# Altium footprint library PCB封装库.PcbLib: 109 footprints (part 4 of 7)
Each footprint in its own frame and in the unit in brackets; x right, y up, seen from the top. Pads: shape width x height; smd on the part's side, far side on the other; paste and mask are expansions set on the pad; w line width, h text height; cw(c..) or ccw(c..) is an arc to the next point about the centre after c.
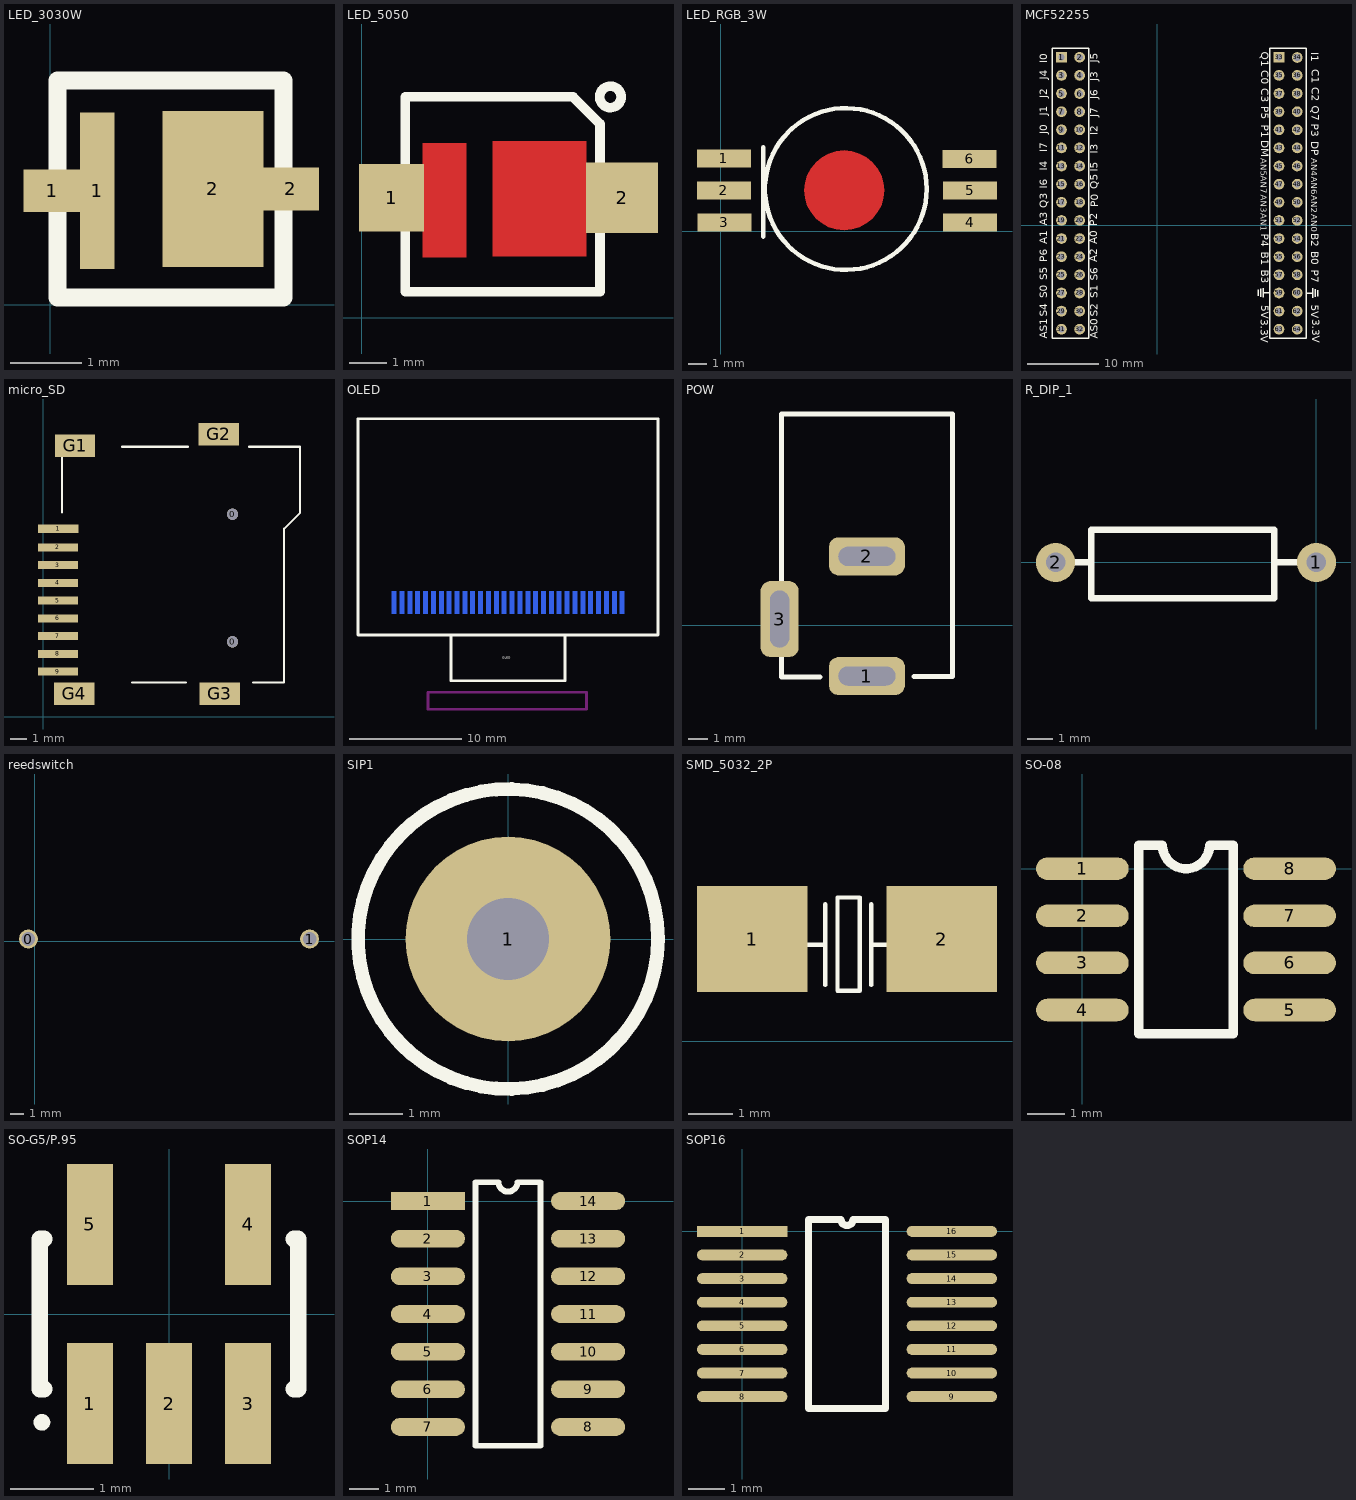
[diagram p3: the footprints below, top view; thin cyan lines are the x and y axes]

## LED_3030W [mm]
pads (4):
  rect 0.8x0.6 smd: 1(0.025,1.6) 2(3.378,1.626)
  rect 0.48x2.2 smd: 1(0.66,1.6)
  rect 1.42x2.2 smd: 2(2.286,1.626)
Top Overlay:
  lines w0.254: 0.102,0.102 3.277,0.102 3.277,3.15 0.102,3.15 0.102,0.102

## LED_5050 [mm]
pads (2):
  rect 1.72x1.78 smd: 1(0.787,3.175)
  rect 1.9x1.87 smd: 2(6.883,3.175)
Top Layer:
  rectangle: 3.454,1.626 5.944,4.674
  rectangle: 1.6,1.6 2.769,4.623
Top Overlay:
  circle w0.254: c6.574,5.842 r0.284
  lines w0.254: 1.143,0.686 1.143,5.842 5.588,5.842 6.299,5.131 6.299,0.686 1.143,0.686
Top Paste:
  rectangle: 1.6,1.6 2.769,4.623
  rectangle: 3.454,1.626 5.944,4.674
Top Solder:
  rectangle: 3.404,1.575 5.994,4.724
  rectangle: 1.549,1.549 2.819,4.674

## LED_RGB_3W [mm]
pads (6):
  rect 3x1 smd: 1(0.178,4.064) 2(0.178,2.286) 3(0.203,0.508) 4(13.868,0.508) 5(13.868,2.286) 6(13.843,4.039)
Top Layer:
  region: 7.301,4.462 7.716,4.336 8.1,4.131 8.436,3.855 8.711,3.519 8.916,3.136 9.042,2.72 9.085,2.287 9.042,1.855 8.916,1.439 8.711,1.056 8.436,0.72 8.1,0.444 7.716,0.239 7.301,0.113 6.868,0.07 6.436,0.113 6.02,0.239 5.636,0.444 5.3,0.72 5.025,1.056 4.82,1.439 4.694,1.855 4.651,2.287 4.694,2.72 4.82,3.136 5.025,3.519 5.3,3.855 5.636,4.131 6.02,4.336 6.436,4.462 6.868,4.504
Top Overlay:
  circle w0.254: c6.955,2.362 r4.5
  lines w0.254: 2.362,-0.279 2.362,4.674

## MCF52255 [mm]
pads (64):
  rect 1.5x1.5 hole 0.9: 1(-13.454,23.521) 33(17.026,23.521)
  round 1.5 hole 0.9: 2(-10.914,23.521) 3(-13.454,20.981) 4(-10.914,20.981) 5(-13.454,18.441) 6(-10.914,18.441) 7(-13.454,15.901) 8(-10.914,15.901) 9(-13.454,13.361) 10(-10.914,13.361) 11(-13.454,10.821) 12(-10.914,10.821) 13(-13.454,8.281) 14(-10.914,8.281) 15(-13.454,5.741) 16(-10.914,5.741) 17(-13.454,3.201) 18(-10.914,3.201) 19(-13.454,0.661) 20(-10.914,0.661) 21(-13.454,-1.879) 22(-10.914,-1.879) 23(-13.454,-4.419) 24(-10.914,-4.419) 25(-13.454,-6.959) 26(-10.914,-6.959) 27(-13.454,-9.499) 28(-10.914,-9.499) 29(-13.454,-12.039) 30(-10.914,-12.039) 31(-13.454,-14.579) 32(-10.914,-14.579) 35(17.026,20.981) 36(19.566,20.981) 37(17.026,18.441) 38(19.566,18.441) 39(17.026,15.901) 40(19.566,15.901) 41(17.026,13.361) 42(19.566,13.361) 43(17.026,10.821) 44(19.566,10.821) 45(17.026,8.281) 46(19.566,8.281) 47(17.026,5.741) 48(19.566,5.741) 49(17.026,3.201) 50(19.566,3.201) 51(17.026,0.661) 52(19.566,0.661) 53(17.026,-1.879) 54(19.566,-1.879) 55(17.026,-4.419) 56(19.566,-4.419) 57(17.026,-6.959) 58(19.566,-6.959) 59(17.026,-9.499) 60(19.566,-9.499) 61(17.026,-12.039) 62(19.566,-12.039) 63(17.026,-14.579) 64(19.566,-14.579)
  round 1.5 hole 1: 34(19.583,23.495)
Top Overlay:
  lines w0.2: 14.13,-9.88 14.13,-9.067 ; 14.486,-10.007 14.486,-8.94 ; 14.841,-10.134 14.841,-8.813 ; 14.841,-9.473 15.705,-9.473 ; 20.886,-9.524 21.75,-9.524 ; 21.75,-10.184 21.75,-8.864 ; 22.106,-10.057 22.106,-8.991 ; 22.461,-9.93 22.461,-9.118 ; -14.724,-15.849 -9.644,-15.849 -9.644,24.791 -14.724,24.791 -14.724,-15.849 ; 15.756,-15.849 20.836,-15.849 20.836,24.791 15.756,24.791 15.756,-15.849
  text "I2" at -8.019,12.574 h1.8
  text "J6" at -8.019,17.654 h1.8
  text "J7" at -8.019,15.114 h1.8
  text "DP" at 21.191,11.736 h1.8
  text "DM" at 14.181,11.863 h1.8
  text "P4" at 14.181,-1.193 h1.8
  text "B3" at 14.181,-6.273 h1.8
  text "B2" at 21.217,-1.142 h1.8
  text "B0" at 21.217,-3.682 h1.8
  text "B1" at 14.181,-3.733 h1.8
  text "C2" at 21.242,19.305 h1.8
  text "C3" at 14.155,19.153 h1.8
  text "C1" at 21.242,21.845 h1.8
  text "C0" at 14.155,21.693 h1.8
  text "J1" at -15.105,15.317 h1.8
  text "J0" at -15.105,12.726 h1.8
  text "I7" at -15.08,10.186 h1.8
  text "I1" at 21.166,24.207 h1.8
  text "I0" at -15.131,22.709 h1.8
  text "Q3" at -15.131,2.389 h1.8
  text "Q5" at -8.044,5.056 h1.8
  text "Q7" at 21.242,16.765 h1.8
  text "Q1" at 14.155,24.283 h1.8
  text "3.3V" at 14.13,-13.207 h1.8
  text "3.3V" at 21.318,-13.156 h1.8
  text "5V" at 14.155,-11.2 h1.8
  text "5V" at 21.217,-11.15 h1.8
  text "P0" at -7.976,2.54 h1.8
  text "P2" at -8.07,-0.151 h1.8
  text "P6" at -15.105,-5.181 h1.8
  text "P1" at 14.181,14.047 h1.8
  text "P3" at 21.217,14.2 h1.8
  text "P5" at 14.181,16.663 h1.8
  text "P7" at 21.191,-6.222 h1.8
  text "AN5" at 14.13,9.399 h1.5
  text "AN7" at 14.13,6.935 h1.5
  text "AN2" at 21.217,4.192 h1.5
  text "AN0" at 21.217,1.55 h1.5
  text "AN1" at 14.105,1.677 h1.5
  text "AN3" at 14.13,4.294 h1.5
  text "AN6" at 21.217,6.808 h1.5
  text "AN4" at 21.217,9.348 h1.5
  text "J2" at -15.131,17.806 h1.8
  text "J3" at -8.019,20.194 h1.8
  text "J4" at -15.131,20.346 h1.8
  text "J5" at -8.019,22.734 h1.8
  text "S0" at -15.105,-10.261 h1.8
  text "S1" at -8.044,-10.261 h1.8
  text "S2" at -8.044,-12.851 h1.8
  text "S4" at -15.105,-12.801 h1.8
  text "S5" at -15.105,-7.721 h1.8
  text "S6" at -8.044,-7.771 h1.8
  text "AS1" at -15.131,-15.95 h1.8
  text "AS0" at -8.019,-15.95 h1.8
  text "A0" at -8.07,-2.691 h1.8
  text "A2" at -8.07,-5.231 h1.8
  text "A1" at -15.105,-2.641 h1.8
  text "A3" at -15.105,-0.101 h1.8
  text "I3" at -8.019,10.034 h1.8
  text "I5" at -8.019,7.494 h1.8
  text "I4" at -15.08,7.646 h1.8
  text "I6" at -15.08,5.106 h1.8
3D body: height 2, standoff -9.54, extent -14.603,4.485 -12.063,24.805
3D body: height 2, standoff -9.54, extent -12.063,4.485 -9.523,24.805
3D body: height 2, standoff -9.54, extent -14.603,-15.835 -12.063,4.485
3D body: height 2, standoff -9.54, extent -12.063,-15.835 -9.523,4.485
3D body: height 2, standoff -9.54, extent 18.188,-15.962 20.728,4.358
3D body: height 2, standoff -9.54, extent 15.648,-15.962 18.188,4.358
3D body: height 2, standoff -9.54, extent 18.188,4.358 20.728,24.678
3D body: height 2, standoff -9.54, extent 15.648,4.358 18.188,24.678

## micro_SD [mm]
pads (15):
  round 0.7 hole 0.7 unplated: 0(11.711,4.641) 0(11.711,12.541)
  rect 2.5x0.5 smd: 1(0.911,11.641) 2(0.9,10.491) 3(0.9,9.391) 4(0.9,8.291) 5(0.9,7.191) 6(0.9,6.091) 7(0.9,4.991) 8(0.9,3.891) 9(0.9,2.791)
  rect 2.5x1.4 smd: G1(1.957,16.786) G2(10.856,17.497) G3(10.907,1.419) G4(1.911,1.419)
Top Overlay:
  lines w0.127: 1.154,12.639 1.154,15.364 1.154,16.424 ; 4.863,16.721 8.951,16.721 ; 5.497,2.116 8.823,2.116 ; 12.736,16.721 15.9,16.721 15.9,12.641 14.9,11.641 14.9,9.641 14.9,2.116 12.965,2.116
3D body: height 1.85, standoff -0.6, extent 0.249,1.346 15.499,17.346

## OLED [mm]
pads (30):
  rect 0.4x2 smd far side: 1(6.599,12.471) 2(7.299,12.471) 3(7.999,12.471) 4(8.699,12.471) 5(9.399,12.471) 6(10.099,12.471) 7(10.799,12.471) 8(11.499,12.471) 9(12.199,12.471) 10(12.899,12.471) 11(13.599,12.471) 12(14.299,12.471) 13(14.999,12.471) 14(15.699,12.471) 15(16.399,12.471) 16(17.099,12.471) 17(17.799,12.471) 18(18.499,12.471) 19(19.199,12.471) 20(19.899,12.471) 21(20.599,12.471) 22(21.299,12.471) 23(21.999,12.471) 24(22.699,12.471) 25(23.399,12.471) 26(24.099,12.471) 27(24.799,12.471) 28(25.499,12.471) 29(26.199,12.471) 30(26.899,12.471)
Top Overlay:
  lines w0.254: 11.659,9.55 11.659,5.486 21.819,5.486 21.819,9.55 ; 20.168,9.55 16.739,9.55 ; 16.739,9.55 30.089,9.55 30.089,28.81 3.389,28.81 3.389,9.55 16.739,9.55
  text "OLED" at 16.205,7.442 h0.2
Bottom Overlay:
  lines w0.254: 5.69,12.471 5.69,8.407 ; 8.525,5.572 5.69,8.407 ; 11.739,5.531 16.739,5.531 21.739,5.531 ; 27.788,12.471 27.788,8.407 ; 5.69,8.407 27.788,8.407 ; 5.69,8.407 9.627,4.47 23.724,4.47 27.661,8.407 27.788,8.407 ; 27.788,8.407 27.743,8.407 27.788,8.407
Keep-Out Layer:
  lines w0.254: 11.786,4.47 21.692,4.47 ; 9.627,2.946 23.724,2.946 23.724,4.47 9.627,4.47 9.627,2.946
3D body: height 0.8, standoff -8.75, extent 3.094,4.476 29.794,28.086

## POW [mm]
pads (3):
  rrect50% 4x2 hole 1 slot 3 at 0 deg: 1(10.969,-2.675) 2(10.969,3.625)
  rrect50% 2x4 hole 1 slot 3 at 90 deg: 3(6.369,0.325)
Top Overlay:
  lines w0.254: 6.469,-1.675 6.469,-2.718 8.512,-2.718 ; 6.469,2.325 6.469,11.125 15.469,11.125 15.469,-2.692 13.451,-2.692
3D body: height 11.02, standoff -3.48, extent 5.966,-2.718 15.472,11.109

## R_DIP_1 [mil]
pads (2):
  round 60 hole 30: 1(0,0) 2(-400,0)
Top Overlay:
  lines w10: -400,0 -345,0 -345,50 -65,50 -65,0 ; -345,5 -345,-55 -65,-55 -65,0 ; -65,0 -15,0 -65,0
3D body: height 100, standoff -139.21, extent -411,-68.09 11,70

## reedswitch [mm]
pads (2):
  round 1.4 hole 1: 0(-0.453,0.16) 1(20.367,0.16)
3D body: height 2.2, standoff -3, extent -0.453,-0.94 20.367,1.26

## SIP1 [mil]
pads (1):
  round 150 hole 60: 1(0,0)
Top Overlay:
  circle w10: c0,0 r110

## SMD_5032_2P [mm]
pads (2):
  rect 2.5x2.4 smd: 1(2.261,2.311) 2(6.553,2.311)
Top Overlay:
  lines w0.1: 3.48,2.184 3.708,2.184 3.912,2.184 ; 3.912,1.27 3.912,3.099 ; 4.953,1.27 4.953,3.099 ; 4.953,2.184 5.156,2.184 5.309,2.184 ; 4.191,1.143 4.699,1.143 4.699,3.251 4.191,3.251 4.191,1.803 4.191,1.143
3D body: height 0.6, standoff 0, extent 2.591,1.473 5.791,3.073

## SO23-5 [mm]

## SO-08 [mil]
pads (8):
  oval 98.43x24 smd: 1(0,0) 2(0,-50) 3(0,-100) 4(0,-150) 5(220,-150) 6(220,-100) 7(220,-50) 8(220,0)
Top Overlay:
  lines w10: 60,-175 160,-175 160,25 135,25 cw(c110,25) 85,25 60,25 60,-175
3D body: height 66.93, standoff 0, extent -8.11,-172 228.11,20.91

## SO-G5/P.95 [mm] "SOT-23/SC-74A; 5 Leads; Body 3.1 x 3 mm, inc. leads (LxW max)"
height 1.45
pads (5):
  rect 0.55x1.45 smd: 1(-0.95,-1.075) 2(0,-1.075) 3(0.95,-1.075) 4(0.95,1.075) 5(-0.95,1.075)
Top Overlay:
  circle w0.1: c-1.525,-1.3 r0.05
  lines w0.2: -1.5,-0.9 -1.55,-0.9 -1.55,0.9 -1.5,0.9 ; 1.5,-0.9 1.55,-0.9 1.55,0.9 1.5,0.9
3D body: height 1.2, standoff 0, extent -1.456,-1.46 1.444,1.34

## SOP14 [mm]
pads (14):
  rect 2.5x0.6 smd: 1(0,0)
  oval 2.5x0.6 smd: 2(0,-1.27) 3(0,-2.54) 4(0,-3.81) 5(0,-5.08) 6(0,-6.35) 7(0,-7.62) 8(5.4,-7.62) 9(5.4,-6.35) 10(5.4,-5.08) 11(5.4,-3.81) 12(5.4,-2.54) 13(5.4,-1.27) 14(5.4,0)
Top Overlay:
  lines w0.2: 1.61,-8.255 3.79,-8.255 3.79,0.635 3.017,0.635 cw(c2.7,0.635) 2.382,0.635 1.61,0.635 1.61,-8.255

## SOP16 [mm]
pads (16):
  rect 2.5x0.3 smd: 1(0,0)
  oval 2.5x0.3 smd: 2(0,-0.653) 3(0,-1.306) 4(0,-1.959) 5(0,-2.612) 6(0,-3.265) 7(0,-3.918) 8(0,-4.571) 9(5.8,-4.571) 10(5.8,-3.918) 11(5.8,-3.265) 12(5.8,-2.612) 13(5.8,-1.959) 14(5.8,-1.306) 15(5.8,-0.653) 16(5.8,0)
Top Overlay:
  lines w0.2: 1.835,-4.898 1.835,0.326 2.737,0.326 ccw(c2.9,0.326) 3.063,0.326 3.965,0.326 3.965,-4.898 1.835,-4.898